# Altium footprint library PcbLib_jp.PcbLib: 255 footprints (part 14 of 16)
Each footprint in its own frame and in the unit in brackets; x right, y up, seen from the top. Pads: shape width x height; smd on the part's side, far side on the other; paste and mask are expansions set on the pad; w line width, h text height; cw(c..) or ccw(c..) is an arc to the next point about the centre after c.
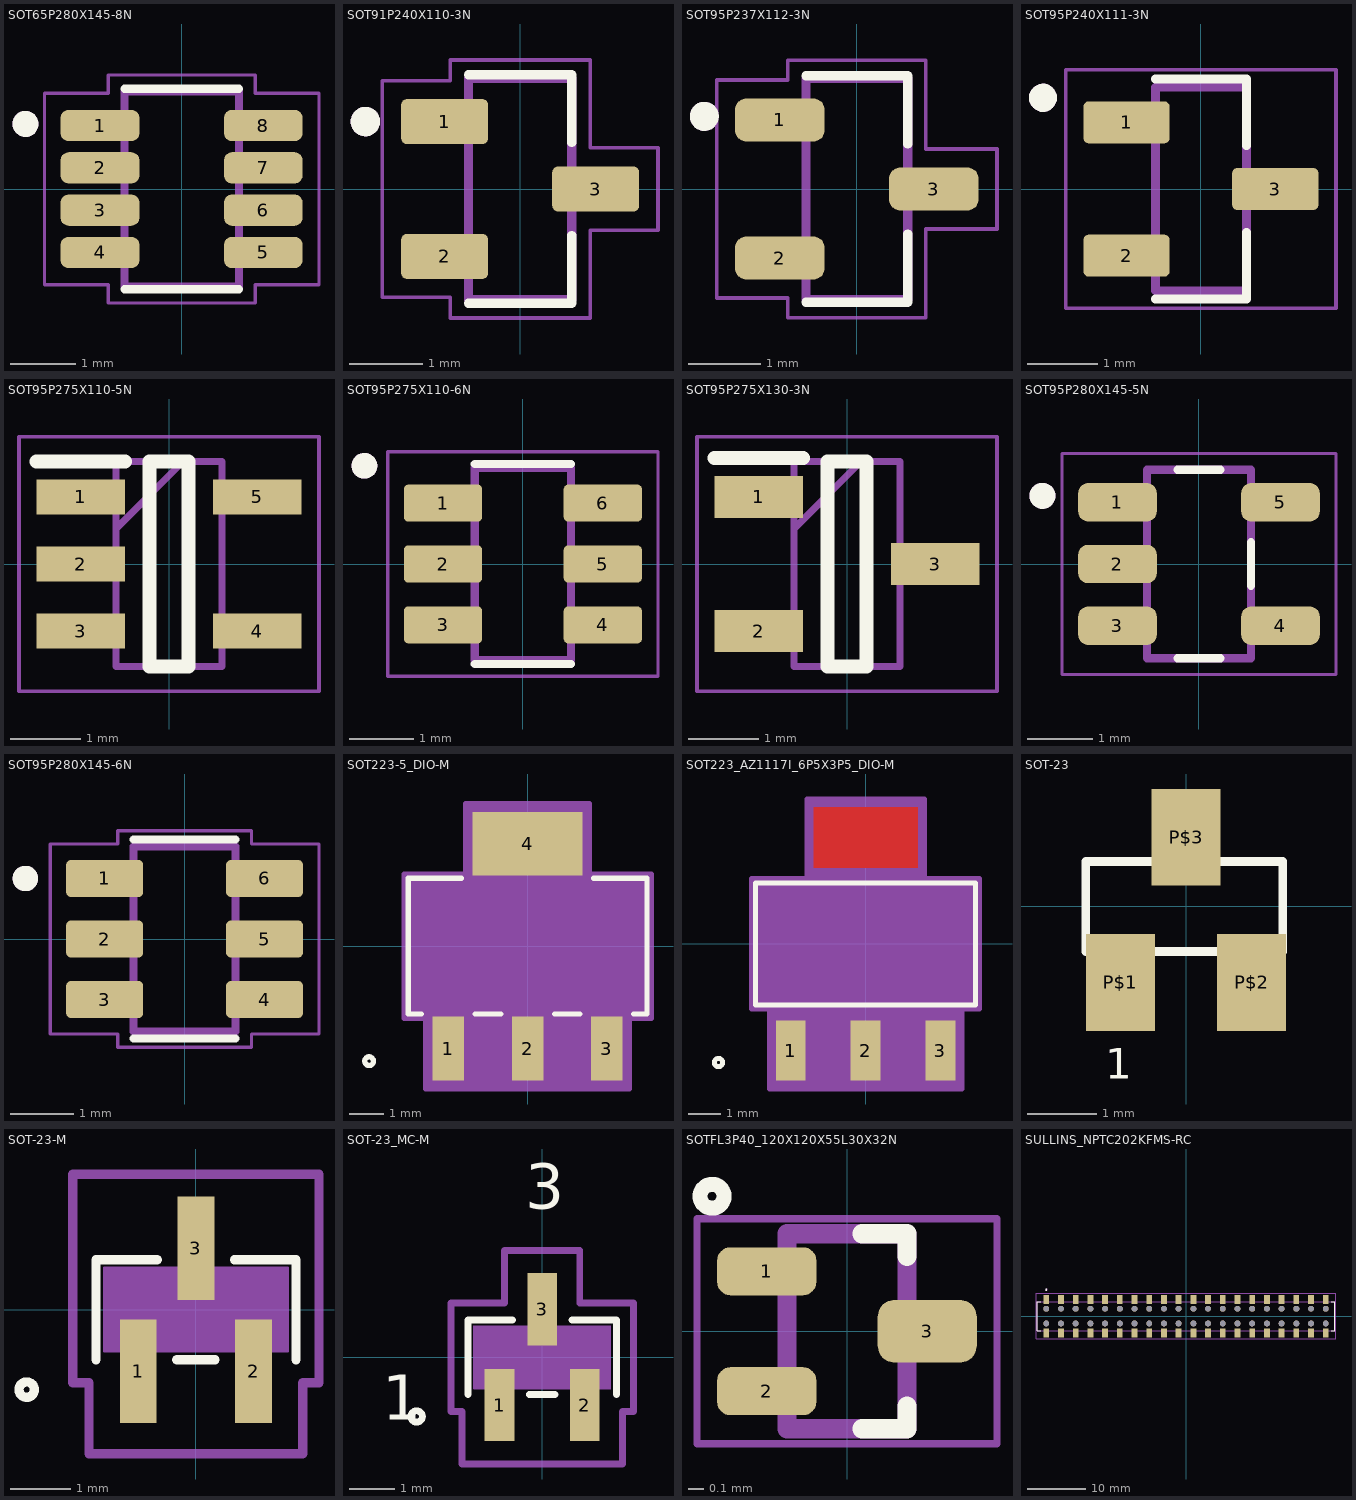
[diagram p13: the footprints below, top view; thin cyan lines are the x and y axes]

## SOT65P280X145-8N [mm]
pads (8):
  rrect50% 1.21x0.48 smd: 1(-1.255,0.975) 2(-1.255,0.325) 3(-1.255,-0.325) 4(-1.255,-0.975) 5(1.255,-0.975) 6(1.255,-0.325) 7(1.255,0.325) 8(1.255,0.975)
Top Overlay:
  circle w0.2: c-2.4,1 r0.1
  lines w0.127: -0.88,-1.54 0.88,-1.54 ; -0.88,1.54 0.88,1.54
Mechanical 13:
  circle w0.2: c-2.4,1 r0.1
  lines w0.127: -0.88,-1.5 0.88,-1.5 0.88,1.5 -0.88,1.5 -0.88,-1.5
Mechanical 15:
  lines w0.05: -2.11,-1.47 -2.11,1.47 -1.13,1.47 -1.13,1.75 1.13,1.75 1.13,1.47 2.11,1.47 2.11,-1.47 1.13,-1.47 1.13,-1.75 -1.13,-1.75 -1.13,-1.47 -2.11,-1.47
3D body "MAX6369KAT.step": height 1.45, standoff 0, extent -1.43,-1.47 1.37,1.43

## SOT91P240X110-3N [mm]
pads (3):
  rrect25% 1.18x0.61 smd: 1(-1.025,0.915) 2(-1.025,-0.915) 3(1.025,0)
Top Overlay:
  circle w0.2: c-2.1,0.915 r0.1
  lines w0.127: -0.7,-1.55 0.7,-1.55 0.7,-0.63 ; -0.7,1.55 0.7,1.55 0.7,0.63
Mechanical 13:
  circle w0.2: c-2.1,0.915 r0.1
  lines w0.127: -0.7,-1.5 -0.7,1.5 0.7,1.5 0.7,-1.5 -0.7,-1.5
Mechanical 15:
  lines w0.05: -1.87,-1.47 -1.87,1.47 -0.95,1.47 -0.95,1.75 0.95,1.75 0.95,0.56 1.87,0.56 1.87,-0.56 0.95,-0.56 0.95,-1.75 -0.95,-1.75 -0.95,-1.47 -1.87,-1.47

## SOT95P237X112-3N [mm]
pads (3):
  rrect50% 1.23x0.59 smd: 1(-1.06,0.95) 2(-1.06,-0.95) 3(1.06,0)
Top Overlay:
  circle w0.2: c-2.1,1 r0.1
  lines w0.127: -0.7,-1.56 0.7,-1.56 0.7,-0.62 ; -0.7,1.56 0.7,1.56 0.7,0.62
Mechanical 13:
  circle w0.2: c-2.1,1 r0.1
  lines w0.127: -0.7,-1.52 0.7,-1.52 0.7,1.52 -0.7,1.52 -0.7,-1.52
Mechanical 15:
  lines w0.05: -1.93,-1.5 -0.95,-1.5 -0.95,-1.77 0.95,-1.77 0.95,-0.55 1.93,-0.55 1.93,0.55 0.95,0.55 0.95,1.77 -0.95,1.77 -0.95,1.5 -1.93,1.5 -1.93,-1.5
3D body "User Library-SOT95P280X135-3M[SOT23_TO-236AA].STEP": height 1.3, standoff 0, extent -1.46,-1.48 1.54,1.52

## SOT95P240X111-3N [mm]
pads (3):
  rrect25% 1.23x0.6 smd: 1(-1.06,0.95) 2(-1.06,-0.95) 3(1.06,0)
Top Overlay:
  circle w0.2: c-2.25,1.3 r0.1
  lines w0.127: -0.65,-1.57 0.65,-1.57 0.65,-0.62 ; -0.65,1.57 0.65,1.57 0.65,0.62
Mechanical 13:
  circle w0.2: c-2.25,1.3 r0.1
  lines w0.127: -0.65,-1.45 0.65,-1.45 0.65,1.45 -0.65,1.45 -0.65,-1.45
Mechanical 15:
  lines w0.05: -1.925,-1.7 -1.925,1.7 1.925,1.7 1.925,-1.7 -1.925,-1.7
3D body "step_temp.STEP": height 1.1, standoff 0, extent -1.15,-1.45 1.15,1.45

## SOT95P275X110-5N [mm]
pads (5):
  rect 1.25x0.5 smd: 1(-1.25,0.95) 2(-1.25,0) 3(-1.25,-0.95) 4(1.25,-0.95) 5(1.25,0.95)
Top Overlay:
  lines w0.2: -1.875,1.45 -0.625,1.45 ; -0.275,-1.45 -0.275,1.45 0.275,1.45 0.275,-1.45 -0.275,-1.45
Mechanical 13:
  lines w0.1: -0.75,0.5 0.2,1.45 ; -0.75,-1.45 -0.75,1.45 0.75,1.45 0.75,-1.45 -0.75,-1.45
Mechanical 15:
  lines w0.05: -2.125,-1.8 -2.125,1.8 2.125,1.8 2.125,-1.8 -2.125,-1.8
3D body "74LVC1G14GV,125.stp": height 1, standoff 0, extent -1.394,-1.477 1.394,1.473

## SOT95P275X110-6N [mm]
pads (6):
  rrect25% 1.22x0.58 smd: 1(-1.245,0.95) 2(-1.245,0) 3(-1.245,-0.95) 4(1.245,-0.95) 5(1.245,0) 6(1.245,0.95)
Top Overlay:
  circle w0.2: c-2.47,1.53 r0.1
  lines w0.127: -0.75,-1.56 0.75,-1.56 ; -0.75,1.56 0.75,1.56
Mechanical 13:
  circle w0.2: c-2.47,1.53 r0.1
  lines w0.127: -0.75,-1.5 0.75,-1.5 0.75,1.5 -0.75,1.5 -0.75,-1.5
Mechanical 15:
  lines w0.05: -2.105,-1.75 2.105,-1.75 2.105,1.75 -2.105,1.75 -2.105,-1.75
3D body "TSOP6_1P70X3P10_ONS.step": height 1.09, standoff 0, extent -1.499,-1.549 1.499,1.549

## SOT95P275X130-3N [mm]
pads (3):
  rect 1.25x0.6 smd: 1(-1.25,0.95) 2(-1.25,-0.95) 3(1.25,0)
Top Overlay:
  lines w0.2: -1.875,1.5 -0.625,1.5 ; -0.275,-1.45 0.275,-1.45 0.275,1.45 -0.275,1.45 -0.275,-1.45
Mechanical 13:
  lines w0.1: -0.75,0.5 0.2,1.45 ; -0.75,-1.45 0.75,-1.45 0.75,1.45 -0.75,1.45 -0.75,-1.45
Mechanical 15:
  lines w0.05: -2.125,-1.8 2.125,-1.8 2.125,1.8 -2.125,1.8 -2.125,-1.8
3D body "M1MA152WAT1G.stp": height 1.3, standoff 0, extent -1.375,-1.45 1.375,1.45

## SOT95P280X145-5N [mm]
pads (5):
  rrect50% 1.21x0.59 smd: 1(-1.255,0.95) 2(-1.255,0) 3(-1.255,-0.95) 4(1.255,-0.95) 5(1.255,0.95)
Top Overlay:
  circle w0.2: c-2.41,1.05 r0.1
  lines w0.127: -0.33,-1.45 0.33,-1.45 ; -0.33,1.45 0.33,1.45 ; 0.8,-0.335 0.8,0.335
Mechanical 13:
  circle w0.2: c-2.41,1.05 r0.1
  lines w0.127: -0.8,-1.45 -0.8,1.45 0.8,1.45 0.8,-1.45 -0.8,-1.45
Mechanical 15:
  lines w0.05: -2.11,-1.7 2.11,-1.7 2.11,1.7 -2.11,1.7 -2.11,-1.7
3D body "CircuitWorks-SOT-23-5.STEP": height 1.35, standoff 0.25, extent -1.45,-1.5 1.05,1.5

## SOT95P280X145-6N [mm]
pads (6):
  rrect25% 1.21x0.58 smd: 1(-1.255,0.95) 2(-1.255,0) 3(-1.255,-0.95) 4(1.255,-0.95) 5(1.255,0) 6(1.255,0.95)
Top Overlay:
  circle w0.2: c-2.5,0.95 r0.1
  lines w0.127: -0.8,-1.56 0.8,-1.56 ; -0.8,1.56 0.8,1.56
Mechanical 13:
  circle w0.2: c-2.5,0.95 r0.1
  lines w0.127: -0.8,-1.45 -0.8,1.45 0.8,1.45 0.8,-1.45 -0.8,-1.45
Mechanical 15:
  lines w0.05: -2.11,-1.49 -2.11,1.49 -1.05,1.49 -1.05,1.7 1.05,1.7 1.05,1.49 2.11,1.49 2.11,-1.49 1.05,-1.49 1.05,-1.7 -1.05,-1.7 -1.05,-1.49 -2.11,-1.49
3D body "User Library-SOT-23-6-THIN.STEP": height 1.1, standoff 0, extent -1.5,-1.5 1.5,1.5

## SOT223-5_DIO-M [mil]
pads (4):
  rect 36x73 smd paste+0 mask+0: 1(-91,-117.5) 2(0,-117.5) 3(91,-117.5)
  rect 126x73 smd paste+0 mask+0: 4(0,117.5)
Top Overlay:
  circle w6: c-182,-132 r5
  lines w6: -121.75,-78 -137,-78 -137,78 -75.75,78 ; -60.25,-78 -30.75,-78 ; 30.75,-78 60.25,-78 ; 75.75,78 137,78 137,-78 121.75,-78
Mechanical 13:
  circle w0: c-122,-63 r5
  lines w1: -132,-73 132,-73 132,73 -132,73 -132,-73 ; -107,-132 -107,-73 -75,-73 -75,-132 -107,-132 ; -61,73 61,73 61,132 -61,132 -61,73 ; -16,-132 -16,-73 16,-73 16,-132 -16,-132 ; 75,-132 75,-73 107,-73 107,-132 75,-132
Mechanical 15:
  region: -142,-83 -142,83 -71,83 -71,164 71,164 71,83 142,83 142,-83 117,-83 117,-164 -117,-164 -117,-83
  lines w6: -142,-83 -142,83 -71,83 -71,164 71,164 71,83 142,83 142,-83 117,-83 117,-164 -117,-164 -117,-83 -142,-83
3D body "SOT223-5_DIO.step": height 71.1, standoff 0, extent -132.01,-132.01 132.01,132.01

## SOT223_AZ1117I_6P5X3P5_DIO-M [mil]
pads (3):
  rect 36x73 smd paste+0 mask+0: 1(-90.55,-129) 2(0,-129) 3(90.55,-129)
Top Layer:
  region: 63,92.5 63,165.5 -63,165.5 -63,92.5
Top Overlay:
  circle w6: c-178,-143.5 r5
  lines w6: -133,-74 133,-74 133,74 -133,74 -133,-74
Top Paste:
  region: 63,92.5 63,165.5 -63,165.5 -63,92.5
Top Solder:
  region: 65,74.5 65,187.5 -65,187.5 -65,74.5
Mechanical 13:
  circle w0: c-118,-59 r5
  lines w1: -128,-69 128,-69 128,69 -128,69 -128,-69 ; -106.55,-143.5 -106.55,-69 -74.55,-69 -74.55,-143.5 -106.55,-143.5 ; -61,69 61,69 61,143.5 -61,143.5 -61,69 ; -16,-143.5 -16,-69 16,-69 16,-143.5 -16,-143.5 ; 74.55,-143.5 74.55,-69 106.55,-69 106.55,-143.5 74.55,-143.5
Mechanical 15:
  region: -138,-79 -138,79 -71,79 -71,175.5 71,175.5 71,79 138,79 138,-79 116.55,-79 116.55,-175.5 -116.55,-175.5 -116.55,-79
  lines w6: -138,-79 -138,79 -71,79 -71,175.5 71,175.5 71,79 138,79 138,-79 116.55,-79 116.55,-175.5 -116.55,-175.5 -116.55,-79 -138,-79
3D body "SOT223_AZ1117I_6P5X3P5_DIO.step": height 71.1, standoff 0, extent -127.99,-143.5 127.99,143.5

## SOT-23 [mm]
pads (3):
  rect 1x1.4 smd: P$1(-0.95,-1.1) P$2(0.95,-1.1) P$3(0,1)
Top Overlay:
  lines w0.127: -1.25,-0.65 -1.25,-1.25 -0.65,-1.25 -0.65,-0.65 ; -1.25,-0.65 -1.45,-0.65 -1.45,0.65 -0.3,0.65 ; -1.25,-0.65 -0.65,-0.65 ; -0.65,-0.65 0.65,-0.65 ; -0.3,0.65 -0.3,1.2 0.3,1.2 0.3,0.65 ; -0.3,0.65 0.3,0.65 ; 0.3,0.65 1.4,0.65 1.4,-0.65 1.25,-0.65 ; 0.65,-0.65 0.65,-1.25 1.25,-1.25 1.25,-0.65 ; 0.65,-0.65 1.25,-0.65
  text "1" at -1.168,-2.642 h0.76
Mechanical 13:
  text "3" at 0,2.542 h1.27
  text "2" at 1.272,-3.817 h1.27
  text "1" at -1.272,-3.815 h1.27
3D body "FDV301N.STEP": height 1.11, standoff 0, extent -1.402,-1.048 1.499,1.352

## SOT-23-M [mil]
pads (3):
  rect 23.94x67.37 smd paste+0 mask+0: 1(-37.5,-39.97) 2(37.5,-39.97) 3(0,39.97)
Top Overlay:
  circle w6: c-110,-52 r5
  lines w6: -65,-32.5 -65,32.5 -25.07,32.5 ; -12.43,-32.5 12.43,-32.5 ; 25.07,32.5 65,32.5 65,-32.5
Mechanical 13:
  circle w0: c-50,-17.5 r5
  lines w1: -60,-27.5 60,-27.5 60,27.5 -60,27.5 -60,-27.5 ; -47.5,-52 -47.5,-27.5 -27.5,-27.5 -27.5,-52 -47.5,-52 ; -10,27.5 10,27.5 10,52 -10,52 -10,27.5 ; 27.5,-52 27.5,-27.5 47.5,-27.5 47.5,-52 27.5,-52
Mechanical 15:
  region: 60,-27.5 -60,-27.5 -60,27.5 60,27.5
  lines w6: -80,-47.5 -80,88 -31.97,88 80,88 80,47.5 80,-47.5 69.47,-47.5 69.47,-93.65 -69.47,-93.65 -69.47,-47.5 -80,-47.5
3D body: height 10, standoff 0, extent 0,0 10,10
3D body "User Library-sot23-1.STEP": height 39.37, standoff 0, extent -56.48,-49.06 58.49,43.07

## SOT-23_MC-M [mm]
pads (3):
  rect 0.659x1.61 smd paste+0 mask+0: 1(-0.95,-1.065) 2(0.95,-1.065) 3(0,1.065)
Top Overlay:
  circle w0.152: c-2.795,-1.32 r0.127
  lines w0.152: -1.652,-0.827 -1.652,0.827 -0.662,0.827 ; -0.288,-0.827 0.288,-0.827 ; 0.662,0.827 1.652,0.827 1.652,-0.827
  text "3" at -0.381,3.302 h1
  text "1" at -3.556,-1.397 h1
Mechanical 13:
  circle w0: c-1.271,-0.446 r0.127
  lines w0.025: -1.525,-0.7 -1.525,0.7 1.525,0.7 1.525,-0.7 -1.525,-0.7 ; -1.229,-1.32 -0.671,-1.32 -0.671,-0.7 -1.229,-0.7 -1.229,-1.32 ; -0.279,0.7 -0.279,1.32 0.279,1.32 0.279,0.7 -0.279,0.7 ; 0.671,-1.32 1.229,-1.32 1.229,-0.7 0.671,-0.7 0.671,-1.32
Mechanical 15:
  region: 1.525,-0.7 -1.525,-0.7 -1.525,0.7 1.525,0.7
  lines w0.152: -2.033,-1.208 -1.787,-1.208 -1.787,-2.378 1.787,-2.378 1.787,-1.208 2.033,-1.208 2.033,1.208 0.837,1.208 0.837,2.378 -0.837,2.378 -0.837,1.208 -2.033,1.208 -2.033,-1.208
3D body "SOT-23_MC-M.step": height 1.12, standoff 0, extent -1.525,-1.193 1.525,1.447
3D body: height 0.25, standoff 0, extent 0,0 0.254,0.254

## SOTFL3P40_120X120X55L30X32N [mm]
pads (3):
  rrect54% 0.66x0.32 smd: 1(-0.535,0.4) 2(-0.535,-0.4)
  rrect54% 0.66x0.42 smd: 3(0.535,0)
Top Overlay:
  circle w0.1: c-0.9,0.9 r0.08
  lines w0.127: 0.1,-0.65 0.4,-0.65 0.4,-0.5 ; 0.1,0.65 0.4,0.65 0.4,0.5
Mechanical 13:
  lines w0.127: -0.4,-0.65 0.4,-0.65 0.4,0.65 -0.4,0.65 -0.4,-0.65
Mechanical 15:
  lines w0.05: -1,-0.75 1,-0.75 1,0.75 -1,0.75 -1,-0.75
3D body "RUM001L02T2CL.STEP": height 0.55, standoff 0, extent -0.62,-0.58 0.58,0.62

## SULLINS_NPTC202KFMS-RC [mm]
pads (80):
  rect 1x1.56 smd: 1(-24.13,2.905) 2(-24.13,-2.905) 3(-21.59,2.905) 4(-21.59,-2.905) 5(-19.05,2.905) 6(-19.05,-2.905) 7(-16.51,2.905) 8(-16.51,-2.905) 9(-13.97,2.905) 10(-13.97,-2.905) 11(-11.43,2.905) 12(-11.43,-2.905) 13(-8.89,2.905) 14(-8.89,-2.905) 15(-6.35,2.905) 16(-6.35,-2.905) 17(-3.81,2.905) 18(-3.81,-2.905) 19(-1.27,2.905) 20(-1.27,-2.905) 21(1.27,2.905) 22(1.27,-2.905) 23(3.81,2.905) 24(3.81,-2.905) 25(6.35,2.905) 26(6.35,-2.905) 27(8.89,2.905) 28(8.89,-2.905) 29(11.43,2.905) 30(11.43,-2.905) 31(13.97,2.905) 32(13.97,-2.905) 33(16.51,2.905) 34(16.51,-2.905) 35(19.05,2.905) 36(19.05,-2.905) 37(21.59,2.905) 38(21.59,-2.905) 39(24.13,2.905) 40(24.13,-2.905)
  round 1.02 hole 1.02 unplated: ""(-24.13,-1.27) ""(-24.13,1.27) ""(-21.59,-1.27) ""(-21.59,1.27) ""(-19.05,-1.27) ""(-19.05,1.27) ""(-16.51,-1.27) ""(-16.51,1.27) ""(-13.97,-1.27) ""(-13.97,1.27) ""(-11.43,-1.27) ""(-11.43,1.27) ""(-8.89,-1.27) ""(-8.89,1.27) ""(-6.35,-1.27) ""(-6.35,1.27) ""(-3.81,-1.27) ""(-3.81,1.27) ""(-1.27,-1.27) ""(-1.27,1.27) ""(1.27,-1.27) ""(1.27,1.27) ""(3.81,-1.27) ""(3.81,1.27) ""(6.35,-1.27) ""(6.35,1.27) ""(8.89,-1.27) ""(8.89,1.27) ""(11.43,-1.27) ""(11.43,1.27) ""(13.97,-1.27) ""(13.97,1.27) ""(16.51,-1.27) ""(16.51,1.27) ""(19.05,-1.27) ""(19.05,1.27) ""(21.59,-1.27) ""(21.59,1.27) ""(24.13,-1.27) ""(24.13,1.27)
Top Overlay:
  circle w0.2: c-24.16,4.56 r0.1
  lines w0.127: -25.1,-2.5 -25.65,-2.5 -25.65,2.5 -25.1,2.5 ; 25.1,-2.5 25.65,-2.5 25.65,2.5 25.1,2.5
Mechanical 13:
  circle w0.2: c-24.08,4.56 r0.1
  lines w0.127: -25.65,-2.5 25.65,-2.5 25.65,2.5 -25.65,2.5 -25.65,-2.5
Mechanical 15:
  lines w0.05: -25.9,-3.935 25.9,-3.935 25.9,3.935 -25.9,3.935 -25.9,-3.935
3D body "NPTC202KFMS-RC.step": height 7.49, standoff 0, extent -25.654,-3.389 25.654,3.469